# Altium integrated library 兰格封装.IntLib: 1176 symbols (part 2 of 6) (continued)
## FPC  1.0MM  14P (continued)
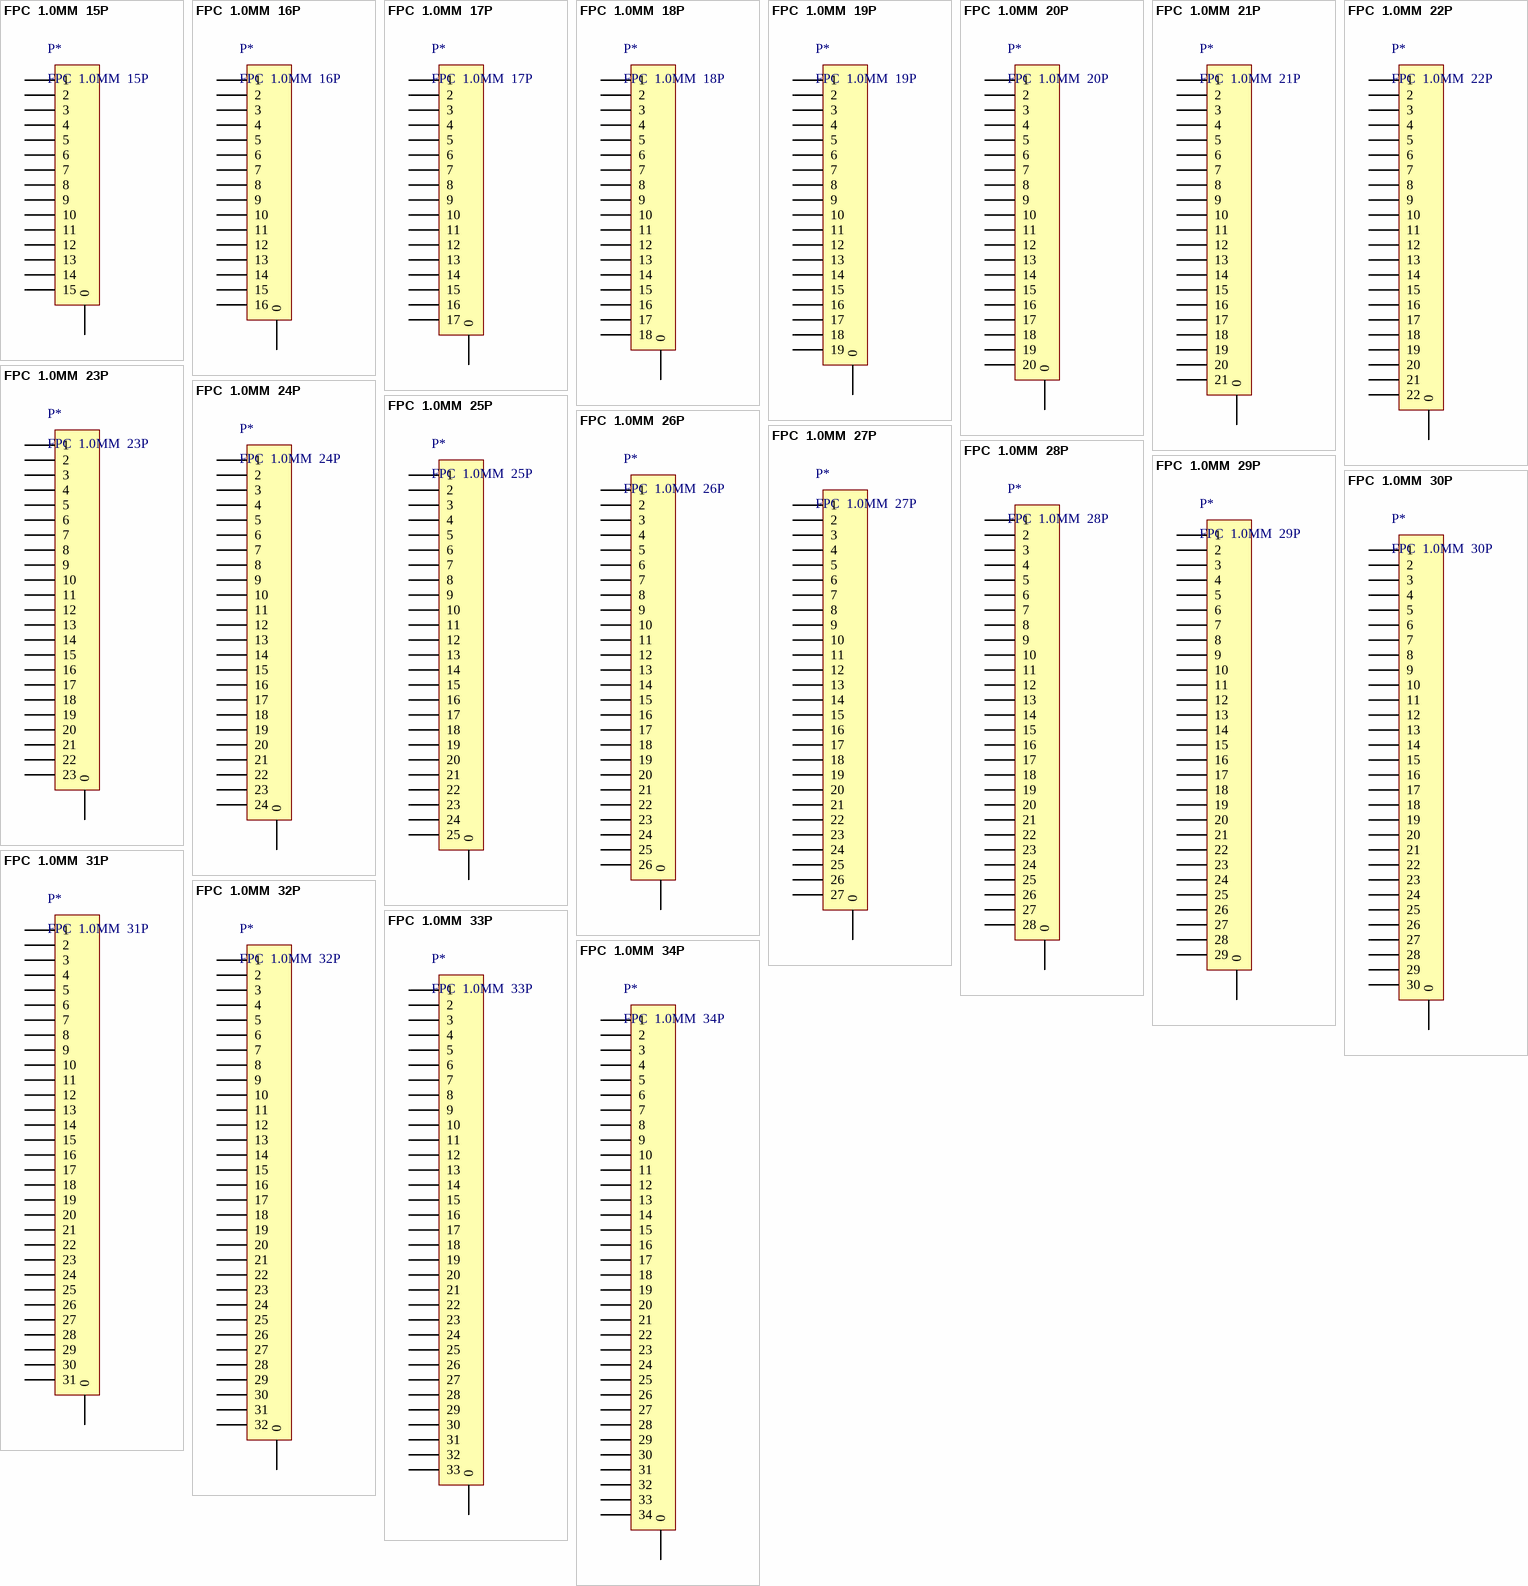
[diagram p15: symbols FPC  1.0MM  15P to FPC  1.0MM  34P]

## FPC  1.0MM  15P
designator P*
仓库名称: 五金仓; 加工方式: 贴片; 物料代码: *; 物料名称: *; 备注: *; 规格型号: *; 单位: *; 助记码: *
footprint FPC  1.0  15P (15 Pns)
pins: 0, 1, 2, 3, 4, 5, 6, 7, 8, 9, 10, 11, 12, 13, 14, 15

## FPC  1.0MM  16P
designator P*
FPC16A-1.0 200MM贴片排线 同向; 物料代码: 3.02.08.07.0001; 单位: 条; 仓库名称: 五金仓; 助记码: FPC16A-1.0TPPX TX; 加工方式: 贴片; 物料名称: FPC16A-1.0 200MM贴片排线 同向; 备注: *; 规格型号: *
footprint FPC  1.0  16P (16 Pns)
pins: 0, 1, 2, 3, 4, 5, 6, 7, 8, 9, 10, 11, 12, 13, 14, 15, 16

## FPC  1.0MM  17P
designator P*
仓库名称: 五金仓; 加工方式: 贴片; 物料代码: *; 物料名称: *; 备注: *; 规格型号: *; 单位: *; 助记码: *
footprint FPC  1.0  17P (17 Pns)
pins: 0, 1, 2, 3, 4, 5, 6, 7, 8, 9, 10, 11, 12, 13, 14, 15, 16, 17

## FPC  1.0MM  18P
designator P*
仓库名称: 五金仓; 加工方式: 贴片; 物料代码: *; 物料名称: *; 备注: *; 规格型号: *; 单位: *; 助记码: *
footprint FPC  1.0  18P (18 Pns)
pins: 0, 1, 2, 3, 4, 5, 6, 7, 8, 9, 10, 11, 12, 13, 14, 15, 16, 17, 18

## FPC  1.0MM  19P
designator P*
仓库名称: 五金仓; 加工方式: 贴片; 物料代码: *; 物料名称: *; 备注: *; 规格型号: *; 单位: *; 助记码: *
footprint FPC  1.0  19P (19 Pns)
pins: 0, 1, 2, 3, 4, 5, 6, 7, 8, 9, 10, 11, 12, 13, 14, 15, 16, 17, 18, 19

## FPC  1.0MM  20P
designator P*
仓库名称: 五金仓; 加工方式: 贴片; 物料代码: *; 物料名称: *; 备注: *; 规格型号: *; 单位: *; 助记码: *
footprint FPC  1.0  20P (20 Pns)
pins: 0, 1, 2, 3, 4, 5, 6, 7, 8, 9, 10, 11, 12, 13, 14, 15, 16, 17, 18, 19, 20

## FPC  1.0MM  21P
designator P*
仓库名称: 五金仓; 加工方式: 贴片; 物料代码: *; 物料名称: *; 备注: *; 规格型号: *; 单位: *; 助记码: *
footprint FPC  1.0  21P (21 Pns)
pins: 0, 1, 2, 3, 4, 5, 6, 7, 8, 9, 10, 11, 12, 13, 14, 15, 16, 17, 18, 19, 20, 21

## FPC  1.0MM  22P
designator P*
仓库名称: 五金仓; 加工方式: 贴片; 物料代码: *; 物料名称: *; 备注: *; 规格型号: *; 单位: *; 助记码: *
footprint FPC  1.0  22P (22 Pns)
pins: 0, 1, 2, 3, 4, 5, 6, 7, 8, 9, 10, 11, 12, 13, 14, 15, 16, 17, 18, 19, 20, 21, 22

## FPC  1.0MM  23P
designator P*
仓库名称: 五金仓; 加工方式: 贴片; 物料代码: *; 物料名称: *; 备注: *; 规格型号: *; 单位: *; 助记码: *
footprint FPC  1.0  23P (23 Pns)
pins: 0, 1, 2, 3, 4, 5, 6, 7, 8, 9, 10, 11, 12, 13, 14, 15, 16, 17, 18, 19, 20, 21, 22, 23

## FPC  1.0MM  24P
designator P*
仓库名称: 五金仓; 加工方式: 贴片; 物料代码: *; 物料名称: *; 备注: *; 规格型号: *; 单位: *; 助记码: *
footprint FPC  1.0  24P (24 Pns)
pins: 0, 1, 2, 3, 4, 5, 6, 7, 8, 9, 10, 11, 12, 13, 14, 15, 16, 17, 18, 19, 20, 21, 22, 23, 24

## FPC  1.0MM  25P
designator P*
仓库名称: 五金仓; 加工方式: 贴片; 物料代码: *; 物料名称: *; 备注: *; 规格型号: *; 单位: *; 助记码: *
footprint FPC  1.0  25P (25 Pns)
pins: 0, 1, 2, 3, 4, 5, 6, 7, 8, 9, 10, 11, 12, 13, 14, 15, 16, 17, 18, 19, 20, 21, 22, 23, 24, 25

## FPC  1.0MM  26P
designator P*
仓库名称: 五金仓; 加工方式: 贴片; 物料代码: *; 物料名称: *; 备注: *; 规格型号: *; 单位: *; 助记码: *
footprint FPC  1.0  26P (26 Pns)
pins: 0, 1, 2, 3, 4, 5, 6, 7, 8, 9, 10, 11, 12, 13, 14, 15, 16, 17, 18, 19, 20, 21, 22, 23, 24, 25, 26

## FPC  1.0MM  27P
designator P*
仓库名称: 五金仓; 加工方式: 贴片; 物料代码: *; 物料名称: *; 备注: *; 规格型号: *; 单位: *; 助记码: *
footprint FPC  1.0  27P (27 Pns)
pins: 0, 1, 2, 3, 4, 5, 6, 7, 8, 9, 10, 11, 12, 13, 14, 15, 16, 17, 18, 19, 20, 21, 22, 23, 24, 25, 26, 27

## FPC  1.0MM  28P
designator P*
仓库名称: 五金仓; 加工方式: 贴片; 物料代码: *; 物料名称: *; 备注: *; 规格型号: *; 单位: *; 助记码: *
footprint FPC  1.0  28P (28 Pns)
pins: 0, 1, 2, 3, 4, 5, 6, 7, 8, 9, 10, 11, 12, 13, 14, 15, 16, 17, 18, 19, 20, 21, 22, 23, 24, 25, 26, 27, 28

## FPC  1.0MM  29P
designator P*
仓库名称: 五金仓; 加工方式: 贴片; 物料代码: *; 物料名称: *; 备注: *; 规格型号: *; 单位: *; 助记码: *
footprint FPC  1.0  29P (29 Pns)
pins: 0, 1, 2, 3, 4, 5, 6, 7, 8, 9, 10, 11, 12, 13, 14, 15, 16, 17, 18, 19, 20, 21, 22, 23, 24, 25, 26, 27, 28, 29

## FPC  1.0MM  30P
designator P*
仓库名称: 五金仓; 加工方式: 贴片; 物料代码: *; 物料名称: *; 备注: *; 规格型号: *; 单位: *; 助记码: *
footprint FPC  1.0  30P (30 Pns)
pins: 0, 1, 2, 3, 4, 5, 6, 7, 8, 9, 10, 11, 12, 13, 14, 15, 16, 17, 18, 19, 20, 21, 22, 23, 24, 25, 26, 27, 28, 29, 30

## FPC  1.0MM  31P
designator P*
仓库名称: 五金仓; 加工方式: 贴片; 物料代码: *; 物料名称: *; 备注: *; 规格型号: *; 单位: *; 助记码: *
footprint FPC  1.0  31P (31 Pns)
pins: 0, 1, 2, 3, 4, 5, 6, 7, 8, 9, 10, 11, 12, 13, 14, 15, 16, 17, 18, 19, 20, 21, 22, 23, 24, 25, 26, 27, 28, 29, 30, 31

## FPC  1.0MM  32P
designator P*
仓库名称: 五金仓; 加工方式: 贴片; 物料代码: *; 物料名称: *; 备注: *; 规格型号: *; 单位: *; 助记码: *
footprint FPC  1.0  32P (32 Pins)
pins: 0, 1, 2, 3, 4, 5, 6, 7, 8, 9, 10, 11, 12, 13, 14, 15, 16, 17, 18, 19, 20, 21, 22, 23, 24, 25, 26, 27, 28, 29, 30, 31, 32

## FPC  1.0MM  33P
designator P*
仓库名称: 五金仓; 加工方式: 贴片; 物料代码: *; 物料名称: *; 备注: *; 规格型号: *; 单位: *; 助记码: *
footprint FPC  1.0  33P (33 Pins)
pins: 0, 1, 2, 3, 4, 5, 6, 7, 8, 9, 10, 11, 12, 13, 14, 15, 16, 17, 18, 19, 20, 21, 22, 23, 24, 25, 26, 27, 28, 29, 30, 31, 32, 33

## FPC  1.0MM  34P
designator P*
仓库名称: 五金仓; 加工方式: 贴片; 物料代码: *; 物料名称: *; 备注: *; 规格型号: *; 单位: *; 助记码: *
footprint FPC  1.0  34P (34 Pins)
pins: 0, 1, 2, 3, 4, 5, 6, 7, 8, 9, 10, 11, 12, 13, 14, 15, 16, 17, 18, 19, 20, 21, 22, 23, 24, 25, 26, 27, 28, 29, 30, 31, 32, 33, 34

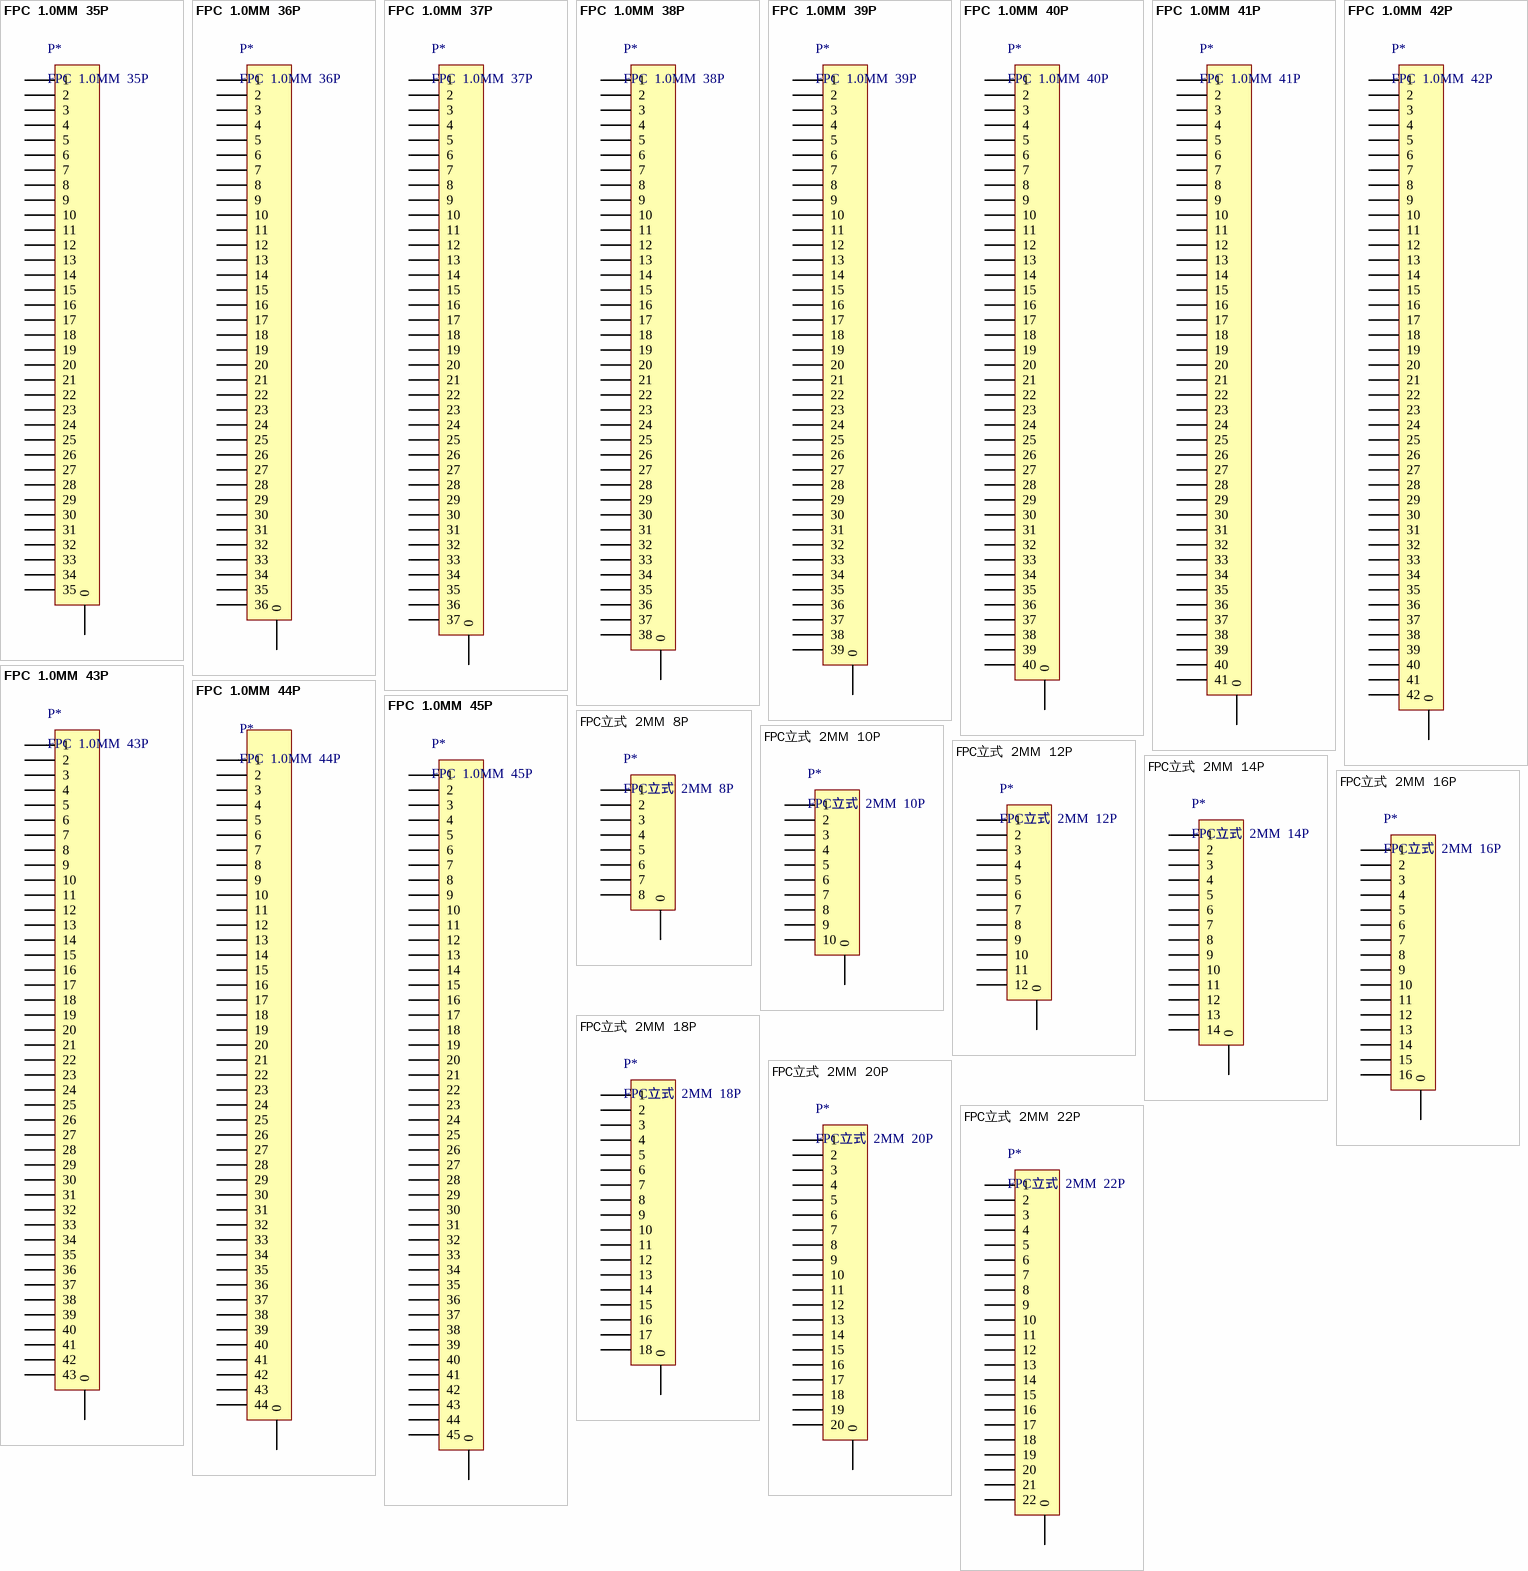
[diagram p16: symbols FPC  1.0MM  35P to FPC立式  2MM  22P]

## FPC  1.0MM  35P
designator P*
仓库名称: 五金仓; 加工方式: 贴片; 物料代码: *; 物料名称: *; 备注: *; 规格型号: *; 单位: *; 助记码: *
footprint FPC  1.0  35P (35 Pins)
pins: 0, 1, 2, 3, 4, 5, 6, 7, 8, 9, 10, 11, 12, 13, 14, 15, 16, 17, 18, 19, 20, 21, 22, 23, 24, 25, 26, 27, 28, 29, 30, 31, 32, 33, 34, 35

## FPC  1.0MM  36P
designator P*
仓库名称: 五金仓; 加工方式: 贴片; 物料代码: *; 物料名称: *; 备注: *; 规格型号: *; 单位: *; 助记码: *
footprint FPC  1.0  36P (36 Pins)
pins: 0, 1, 2, 3, 4, 5, 6, 7, 8, 9, 10, 11, 12, 13, 14, 15, 16, 17, 18, 19, 20, 21, 22, 23, 24, 25, 26, 27, 28, 29, 30, 31, 32, 33, 34, 35, 36

## FPC  1.0MM  37P
designator P*
仓库名称: 五金仓; 加工方式: 贴片; 物料代码: *; 物料名称: *; 备注: *; 规格型号: *; 单位: *; 助记码: *
footprint FPC  1.0  37P (37 Pins)
pins: 0, 1, 2, 3, 4, 5, 6, 7, 8, 9, 10, 11, 12, 13, 14, 15, 16, 17, 18, 19, 20, 21, 22, 23, 24, 25, 26, 27, 28, 29, 30, 31, 32, 33, 34, 35, 36, 37

## FPC  1.0MM  38P
designator P*
仓库名称: 五金仓; 加工方式: 贴片; 物料代码: *; 物料名称: *; 备注: *; 规格型号: *; 单位: *; 助记码: *
footprint FPC  1.0  38P (41 Pins)
pins: 0, 1, 2, 3, 4, 5, 6, 7, 8, 9, 10, 11, 12, 13, 14, 15, 16, 17, 18, 19, 20, 21, 22, 23, 24, 25, 26, 27, 28, 29, 30, 31, 32, 33, 34, 35, 36, 37, 38

## FPC  1.0MM  39P
designator P*
仓库名称: 五金仓; 加工方式: 贴片; 物料代码: *; 物料名称: *; 备注: *; 规格型号: *; 单位: *; 助记码: *
footprint FPC  1.0  39P (39 Pins)
pins: 0, 1, 2, 3, 4, 5, 6, 7, 8, 9, 10, 11, 12, 13, 14, 15, 16, 17, 18, 19, 20, 21, 22, 23, 24, 25, 26, 27, 28, 29, 30, 31, 32, 33, 34, 35, 36, 37, 38, 39

## FPC  1.0MM  40P
designator P*
仓库名称: 五金仓; 加工方式: 贴片; 物料代码: *; 物料名称: *; 备注: *; 规格型号: *; 单位: *; 助记码: *
footprint FPC  1.0  40P (40 Pins)
pins: 0, 1, 2, 3, 4, 5, 6, 7, 8, 9, 10, 11, 12, 13, 14, 15, 16, 17, 18, 19, 20, 21, 22, 23, 24, 25, 26, 27, 28, 29, 30, 31, 32, 33, 34, 35, 36, 37, 38, 39, 40

## FPC  1.0MM  41P
designator P*
仓库名称: 五金仓; 加工方式: 贴片; 物料代码: *; 物料名称: *; 备注: *; 规格型号: *; 单位: *; 助记码: *
footprint FPC  1.0  41P (41 Pins)
pins: 0, 1, 2, 3, 4, 5, 6, 7, 8, 9, 10, 11, 12, 13, 14, 15, 16, 17, 18, 19, 20, 21, 22, 23, 24, 25, 26, 27, 28, 29, 30, 31, 32, 33, 34, 35, 36, 37, 38, 39, 40, 41

## FPC  1.0MM  42P
designator P*
仓库名称: 五金仓; 加工方式: 贴片; 物料代码: *; 物料名称: *; 备注: *; 规格型号: *; 单位: *; 助记码: *
footprint FPC  1.0  42P (42 Pins)
pins: 0, 1, 2, 3, 4, 5, 6, 7, 8, 9, 10, 11, 12, 13, 14, 15, 16, 17, 18, 19, 20, 21, 22, 23, 24, 25, 26, 27, 28, 29, 30, 31, 32, 33, 34, 35, 36, 37, 38, 39, 40, 41, 42

## FPC  1.0MM  43P
designator P*
仓库名称: 五金仓; 加工方式: 贴片; 物料代码: *; 物料名称: *; 备注: *; 规格型号: *; 单位: *; 助记码: *
footprint FPC  1.0  43P (43 Pins)
pins: 0, 1, 2, 3, 4, 5, 6, 7, 8, 9, 10, 11, 12, 13, 14, 15, 16, 17, 18, 19, 20, 21, 22, 23, 24, 25, 26, 27, 28, 29, 30, 31, 32, 33, 34, 35, 36, 37, 38, 39, 40, 41, 42, 43

## FPC  1.0MM  44P
designator P*
仓库名称: 五金仓; 加工方式: 贴片; 物料代码: *; 物料名称: *; 备注: *; 规格型号: *; 单位: *; 助记码: *
footprint FPC  1.0  44P (44 Pins)
pins: 0, 1, 2, 3, 4, 5, 6, 7, 8, 9, 10, 11, 12, 13, 14, 15, 16, 17, 18, 19, 20, 21, 22, 23, 24, 25, 26, 27, 28, 29, 30, 31, 32, 33, 34, 35, 36, 37, 38, 39, 40, 41, 42, 43, 44

## FPC  1.0MM  45P
designator P*
仓库名称: 五金仓; 加工方式: 贴片; 物料代码: *; 物料名称: *; 备注: *; 规格型号: *; 单位: *; 助记码: *
footprint FPC  1.0  45P (45 Pins)
pins: 0, 1, 2, 3, 4, 5, 6, 7, 8, 9, 10, 11, 12, 13, 14, 15, 16, 17, 18, 19, 20, 21, 22, 23, 24, 25, 26, 27, 28, 29, 30, 31, 32, 33, 34, 35, 36, 37, 38, 39, 40, 41, 42, 43, 44, 45

## FPC立式  2MM  8P
designator P*
单位: ֻ; 仓库名称: 五金仓; 加工方式: 贴片; 物料代码: *; 物料名称: *; 备注: *; 规格型号: *; 助记码: *
footprint FPC立式  2MM  8P (连接DSP)
pins: 0, 1, 2, 3, 4, 5, 6, 7, 8

## FPC立式  2MM  10P
designator P*
单位: ֻ; 仓库名称: 五金仓; 加工方式: 贴片; 物料代码: *; 物料名称: *; 备注: *; 规格型号: *; 助记码: *
footprint FPC立式  2MM  10P (连DSP)
pins: 0, 1, 2, 3, 4, 5, 6, 7, 8, 9, 10

## FPC立式  2MM  12P
designator P*
单位: ֻ; 仓库名称: 五金仓; 加工方式: 贴片; 物料代码: *; 物料名称: *; 备注: *; 规格型号: *; 助记码: *
footprint FPC立式  2MM  12P (连DSP)
pins: 0, 1, 2, 3, 4, 5, 6, 7, 8, 9, 10, 11, 12

## FPC立式  2MM  14P
designator P*
单位: ֻ; 仓库名称: 五金仓; 加工方式: 贴片; 物料代码: *; 物料名称: *; 备注: *; 规格型号: *; 助记码: *
footprint FPC立式  2MM  14P (连DSP)
pins: 0, 1, 2, 3, 4, 5, 6, 7, 8, 9, 10, 11, 12, 13, 14

## FPC立式  2MM  16P
designator P*
FPC16A-1.0立式贴片排线座; 物料代码: 3.02.08.07.0002; 单位: ֻ; 仓库名称: 五金仓; 助记码: FPC16A-1.0LSTPPXZ; 加工方式: 贴片; 物料名称: FPC16A-1.0立式贴片排线座; 备注: *; 规格型号: *
footprint FPC立式  2MM  16P (连DSP)
pins: 0, 1, 2, 3, 4, 5, 6, 7, 8, 9, 10, 11, 12, 13, 14, 15, 16

## FPC立式  2MM  18P
designator P*
单位: ֻ; 仓库名称: 五金仓; 加工方式: 贴片; 物料代码: *; 物料名称: *; 备注: *; 规格型号: *; 助记码: *
footprint FPC立式  2MM  18P (连DSP)
pins: 0, 1, 2, 3, 4, 5, 6, 7, 8, 9, 10, 11, 12, 13, 14, 15, 16, 17, 18

## FPC立式  2MM  20P
designator P*
单位: ֻ; 仓库名称: 五金仓; 加工方式: 贴片; 物料代码: *; 物料名称: *; 备注: *; 规格型号: *; 助记码: *
footprint FPC立式  2MM  20P (连DSP)
pins: 0, 1, 2, 3, 4, 5, 6, 7, 8, 9, 10, 11, 12, 13, 14, 15, 16, 17, 18, 19, 20

## FPC立式  2MM  22P
designator P*
单位: ֻ; 仓库名称: 五金仓; 加工方式: 贴片; 物料代码: *; 物料名称: *; 备注: *; 规格型号: *; 助记码: *
footprint FPC立式  2MM  22P (连DSP)
pins: 0, 1, 2, 3, 4, 5, 6, 7, 8, 9, 10, 11, 12, 13, 14, 15, 16, 17, 18, 19, 20, 21, 22

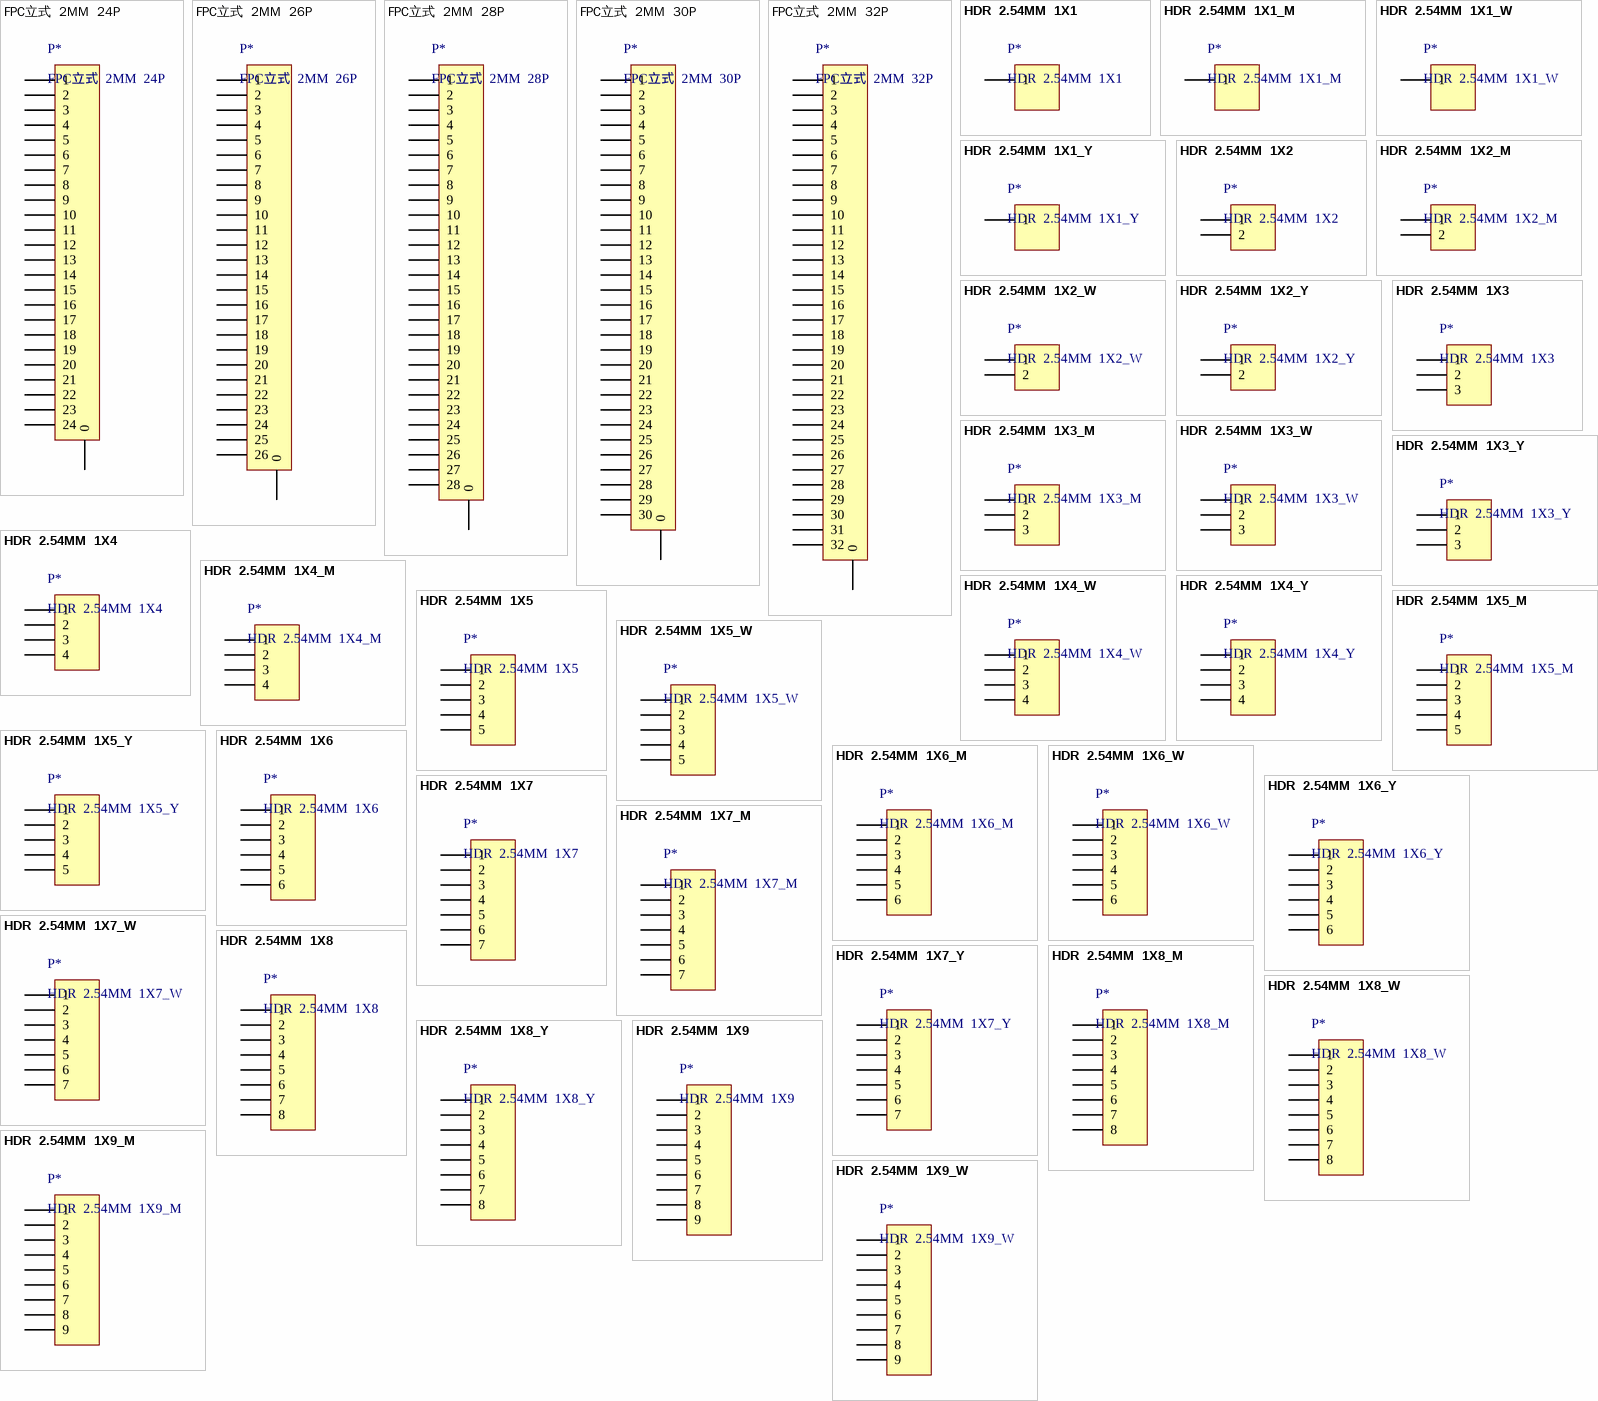
[diagram p17: symbols FPC立式  2MM  24P to HDR  2.54MM  1X9_W]

## FPC立式  2MM  24P
designator P*
单位: ֻ; 仓库名称: 五金仓; 加工方式: 贴片; 物料代码: *; 物料名称: *; 备注: *; 规格型号: *; 助记码: *
footprint FPC立式  2MM  24P (连DSP)
pins: 0, 1, 2, 3, 4, 5, 6, 7, 8, 9, 10, 11, 12, 13, 14, 15, 16, 17, 18, 19, 20, 21, 22, 23, 24

## FPC立式  2MM  26P
designator P*
单位: ֻ; 仓库名称: 五金仓; 加工方式: 贴片; 物料代码: *; 物料名称: *; 备注: *; 规格型号: *; 助记码: *
footprint FPC立式  2MM  26P (连DSP)
pins: 0, 1, 2, 3, 4, 5, 6, 7, 8, 9, 10, 11, 12, 13, 14, 15, 16, 17, 18, 19, 20, 21, 22, 23, 24, 25, 26

## FPC立式  2MM  28P
designator P*
单位: ֻ; 仓库名称: 五金仓; 加工方式: 贴片; 物料代码: *; 物料名称: *; 备注: *; 规格型号: *; 助记码: *
footprint FPC立式  2MM  28P (连DSP)
pins: 0, 1, 2, 3, 4, 5, 6, 7, 8, 9, 10, 11, 12, 13, 14, 15, 16, 17, 18, 19, 20, 21, 22, 23, 24, 25, 26, 27, 28

## FPC立式  2MM  30P
designator P*
单位: ֻ; 仓库名称: 五金仓; 加工方式: 贴片; 物料代码: *; 物料名称: *; 备注: *; 规格型号: *; 助记码: *
footprint FPC立式  2MM  30P (连DSP)
pins: 0, 1, 2, 3, 4, 5, 6, 7, 8, 9, 10, 11, 12, 13, 14, 15, 16, 17, 18, 19, 20, 21, 22, 23, 24, 25, 26, 27, 28, 29, 30

## FPC立式  2MM  32P
designator P*
单位: ֻ; 仓库名称: 五金仓; 加工方式: 贴片; 物料代码: *; 物料名称: *; 备注: *; 规格型号: *; 助记码: *
footprint FPC立式  2MM  32P (连DSP)
pins: 0, 1, 2, 3, 4, 5, 6, 7, 8, 9, 10, 11, 12, 13, 14, 15, 16, 17, 18, 19, 20, 21, 22, 23, 24, 25, 26, 27, 28, 29, 30, 31, 32

## HDR  2.54MM  1X1
designator P*
仓库名称: 五金仓; 加工方式: 插件; 规格型号: *; 物料代码: *; 物料名称: *; 备注: *; 单位: *; 助记码: *
footprint HDR-1X1 (排针，1脚)
pins: 1

## HDR  2.54MM  1X1_M
designator P*
仓库名称: 五金仓; 加工方式: 插件; 规格型号: *; 物料名称: *; 备注: *; 物料代码: *; 单位: *; 助记码: *
footprint HDR-1X1_M (排母，1脚)
pins: 1

## HDR  2.54MM  1X1_W
designator P*
仓库名称: 五金仓; 加工方式: 插件; 物料名称: *; 规格型号: *; 助记码: *; 单位: *; 备注: *; 物料代码: *
footprint HDR-1X1_W (弯脚排针，1脚)
pins: 1

## HDR  2.54MM  1X1_Y
designator P*
仓库名称: 五金仓; 加工方式: 插件; 规格型号: *; 物料代码: *; 物料名称: *; 助记码: *; 单位: *; 备注: *
footprint HDR-1X1_Y (圆孔排母，1脚)
pins: 1

## HDR  2.54MM  1X2
designator P*
仓库名称: 五金仓; 加工方式: 插件; 规格型号: *; 物料名称: *; 助记码: *; 单位: *; 备注: *; 物料代码: *
footprint HDR-1x2 (排针，2脚)
pins: 1, 2

## HDR  2.54MM  1X2_M
designator P*
仓库名称: 五金仓; 加工方式: 插件; 规格型号: *; 备注: *; 物料代码: *; 助记码: *; 物料名称: *; 单位: *
footprint HDR-1X2_M (排母，2脚)
pins: 1, 2

## HDR  2.54MM  1X2_W
designator P*
仓库名称: 五金仓; 加工方式: 插件; 规格型号: *; 助记码: *; 单位: *; 备注: *; 物料代码: *; 物料名称: *
footprint HDR-1X2_W (弯脚排针，2脚)
pins: 1, 2

## HDR  2.54MM  1X2_Y
designator P*
仓库名称: 五金仓; 加工方式: 插件; 规格型号: *; 单位: *; 助记码: *; 备注: *; 物料代码: *; 物料名称: *
footprint HDR-1X2_Y (圆孔排母，2脚)
pins: 1, 2

## HDR  2.54MM  1X3
designator P*
仓库名称: 五金仓; 加工方式: 插件; 助记码: *; 单位: *; 备注: *; 物料代码: *; 物料名称: *; 规格型号: *
footprint HDR-1X3 (排针，3脚)
pins: 1, 2, 3

## HDR  2.54MM  1X3_M
designator P*
仓库名称: 五金仓; 加工方式: 插件; 规格型号: *; 备注: *; 单位: *; 物料代码: *; 助记码: *
footprint HDR-1X3_M (排母，3脚)
pins: 1, 2, 3

## HDR  2.54MM  1X3_W
designator P*
仓库名称: 五金仓; 加工方式: 插件; 助记码: *; 规格型号: *; 物料代码: *; 物料名称: *; 单位: *; 备注: *
footprint HDR-1X3_W (弯脚排针，3脚)
pins: 1, 2, 3

## HDR  2.54MM  1X3_Y
designator P*
仓库名称: 五金仓; 加工方式: 插件; 物料名称: *; 规格型号: *; 助记码: *; 单位: *; 备注: *; 物料代码: *
footprint HDR-1X3_Y (圆孔排母，3脚)
pins: 1, 2, 3

## HDR  2.54MM  1X4
designator P*
仓库名称: 五金仓; 加工方式: 插件; 规格型号: *; 助记码: *; 单位: *; 备注: *; 物料代码: *; 物料名称: *
footprint HDR-1X4 (排针，4脚)
pins: 1, 2, 3, 4

## HDR  2.54MM  1X4_M
designator P*
仓库名称: 五金仓; 加工方式: 插件; 规格型号: *; 助记码: *; 单位: *; 备注: *; 物料代码: *; 物料名称: *
footprint HDR-1X4_M (排母，4脚)
pins: 1, 2, 3, 4

## HDR  2.54MM  1X4_W
designator P*
仓库名称: 五金仓; 加工方式: 插件; 规格型号: *; 助记码: *; 单位: *; 备注: *; 物料代码: *; 物料名称: *
footprint HDR-1X4_W (弯脚排针，4脚)
pins: 1, 2, 3, 4

## HDR  2.54MM  1X4_Y
designator P*
仓库名称: 五金仓; 加工方式: 插件; 规格型号: *; 物料名称: *; 助记码: *; 备注: *; 物料代码: *; 单位: *
footprint HDR-1X4_Y (圆孔排母，4脚)
pins: 1, 2, 3, 4

## HDR  2.54MM  1X5
designator P*
仓库名称: 五金仓; 加工方式: 插件; 单位: *; 助记码: *; 备注: *; 物料代码: *; 物料名称: *; 规格型号: *
footprint HDR-1X5 (排针，5脚)
pins: 1, 2, 3, 4, 5

## HDR  2.54MM  1X5_M
designator P*
仓库名称: 五金仓; 加工方式: 插件; 物料代码: *; 备注: *; 规格型号: *; 物料名称: *; 单位: *; 助记码: *
footprint HDR-1X5_M (排母，5脚)
pins: 1, 2, 3, 4, 5

## HDR  2.54MM  1X5_W
designator P*
仓库名称: 五金仓; 加工方式: 插件; 助记码: *; 备注: *; 物料代码: *; 物料名称: *; 规格型号: *; 单位: *
footprint HDR-1X5_W (弯脚排针，5脚)
pins: 1, 2, 3, 4, 5

## HDR  2.54MM  1X5_Y
designator P*
仓库名称: 五金仓; 加工方式: 插件; 助记码: *; 物料名称: *; 规格型号: *; 单位: *; 备注: *; 物料代码: *
footprint HDR-1X5_Y (圆孔排母，5脚)
pins: 1, 2, 3, 4, 5

## HDR  2.54MM  1X6
designator P*
仓库名称: 五金仓; 加工方式: 插件; 助记码: *; 物料代码: *; 单位: *; 备注: *; 物料名称: *; 规格型号: *
footprint HDR-1X6 (排针，6脚)
pins: 1, 2, 3, 4, 5, 6

## HDR  2.54MM  1X6_M
designator P*
仓库名称: 五金仓; 加工方式: 插件; 物料名称: *; 规格型号: *; 助记码: *; 单位: *; 备注: *; 物料代码: *
footprint HDR-1X6_M (排母，6脚)
pins: 1, 2, 3, 4, 5, 6

## HDR  2.54MM  1X6_W
designator P*
仓库名称: 五金仓; 加工方式: 插件; 助记码: *; 单位: *; 备注: *; 物料代码: *; 物料名称: *; 规格型号: *
footprint HDR-1X6_W (弯脚排针，6脚)
pins: 1, 2, 3, 4, 5, 6

## HDR  2.54MM  1X6_Y
designator P*
仓库名称: 五金仓; 加工方式: 插件; 助记码: *; 单位: *; 备注: *; 物料代码: *; 物料名称: *; 规格型号: *
footprint HDR-1X6_Y (圆孔排母，6脚)
pins: 1, 2, 3, 4, 5, 6

## HDR  2.54MM  1X7
designator P*
仓库名称: 五金仓; 加工方式: 插件; 规格型号: *; 助记码: *; 单位: *; 备注: *; 物料代码: *; 物料名称: *
footprint HDR-1X7 (排针，8脚)
pins: 1, 2, 3, 4, 5, 6, 7

## HDR  2.54MM  1X7_M
designator P*
仓库名称: 五金仓; 加工方式: 插件; 助记码: *; 单位: *; 备注: *; 物料代码: *; 物料名称: *; 饿了的吗: *
footprint HDR-1X7_M (排母，7脚)
pins: 1, 2, 3, 4, 5, 6, 7

## HDR  2.54MM  1X7_W
designator P*
仓库名称: 五金仓; 加工方式: 插件; 单位: *; 助记码: *; 物料名称: *; 规格型号: *; 备注: *; 物料代码: *
footprint HDR-1X7_W (弯脚排针，7脚)
pins: 1, 2, 3, 4, 5, 6, 7

## HDR  2.54MM  1X7_Y
designator P*
仓库名称: 五金仓; 加工方式: 插件; 助记码: *; 单位: *; 备注: *; 物料代码: *; 物料名称: *; 规格型号: *
footprint HDR-1X7_Y (圆孔排母，7脚)
pins: 1, 2, 3, 4, 5, 6, 7

## HDR  2.54MM  1X8
designator P*
仓库名称: 五金仓; 加工方式: 插件; 助记码: *; 单位: *; 备注: *; 物料代码: *; 物料名称: *; 规格型号: *
footprint HDR-1X8 (排针，8脚)
pins: 1, 2, 3, 4, 5, 6, 7, 8

## HDR  2.54MM  1X8_M
designator P*
仓库名称: 五金仓; 加工方式: 插件; 助记码: *; 单位: *; 备注: *; 物料名称: *; 物料代码: *; 规格型号: *
footprint HDR-1X8_M (排母，8脚)
pins: 1, 2, 3, 4, 5, 6, 7, 8

## HDR  2.54MM  1X8_W
designator P*
仓库名称: 五金仓; 加工方式: 插件; 助记码: *; 单位: *; 物料代码: *; 备注: *; 规格型号: *; 物料名称: *
footprint HDR-1X8_W (弯脚排针，8脚)
pins: 1, 2, 3, 4, 5, 6, 7, 8

## HDR  2.54MM  1X8_Y
designator P*
仓库名称: 五金仓; 加工方式: 插件; 物料名称: *; 单位: *; 助记码: *; 规格型号: *; 物料代码: *; 备注: *
footprint HDR-1X8_Y (圆孔排母，8脚)
pins: 1, 2, 3, 4, 5, 6, 7, 8

## HDR  2.54MM  1X9
designator P*
仓库名称: 五金仓; 加工方式: 插件; 助记码: *; 单位: *; 备注: *; 物料代码: *; 物料名称: *; 规格型号: *
footprint HDR-1X9 (排针，9脚)
pins: 1, 2, 3, 4, 5, 6, 7, 8, 9

## HDR  2.54MM  1X9_M
designator P*
仓库名称: 五金仓; 加工方式: 插件; 物料名称: *; 规格型号: *; 助记码: *; 单位: *; 备注: *; 物料代码: *
footprint HDR-1X9_M (排母，9脚)
pins: 1, 2, 3, 4, 5, 6, 7, 8, 9

## HDR  2.54MM  1X9_W
designator P*
仓库名称: 五金仓; 加工方式: 插件; 助记码: *; 物料名称: *; 备注: *; 规格型号: *; 物料代码: *; 单位: *
footprint HDR-1X9_W (弯脚排针，9脚)
pins: 1, 2, 3, 4, 5, 6, 7, 8, 9

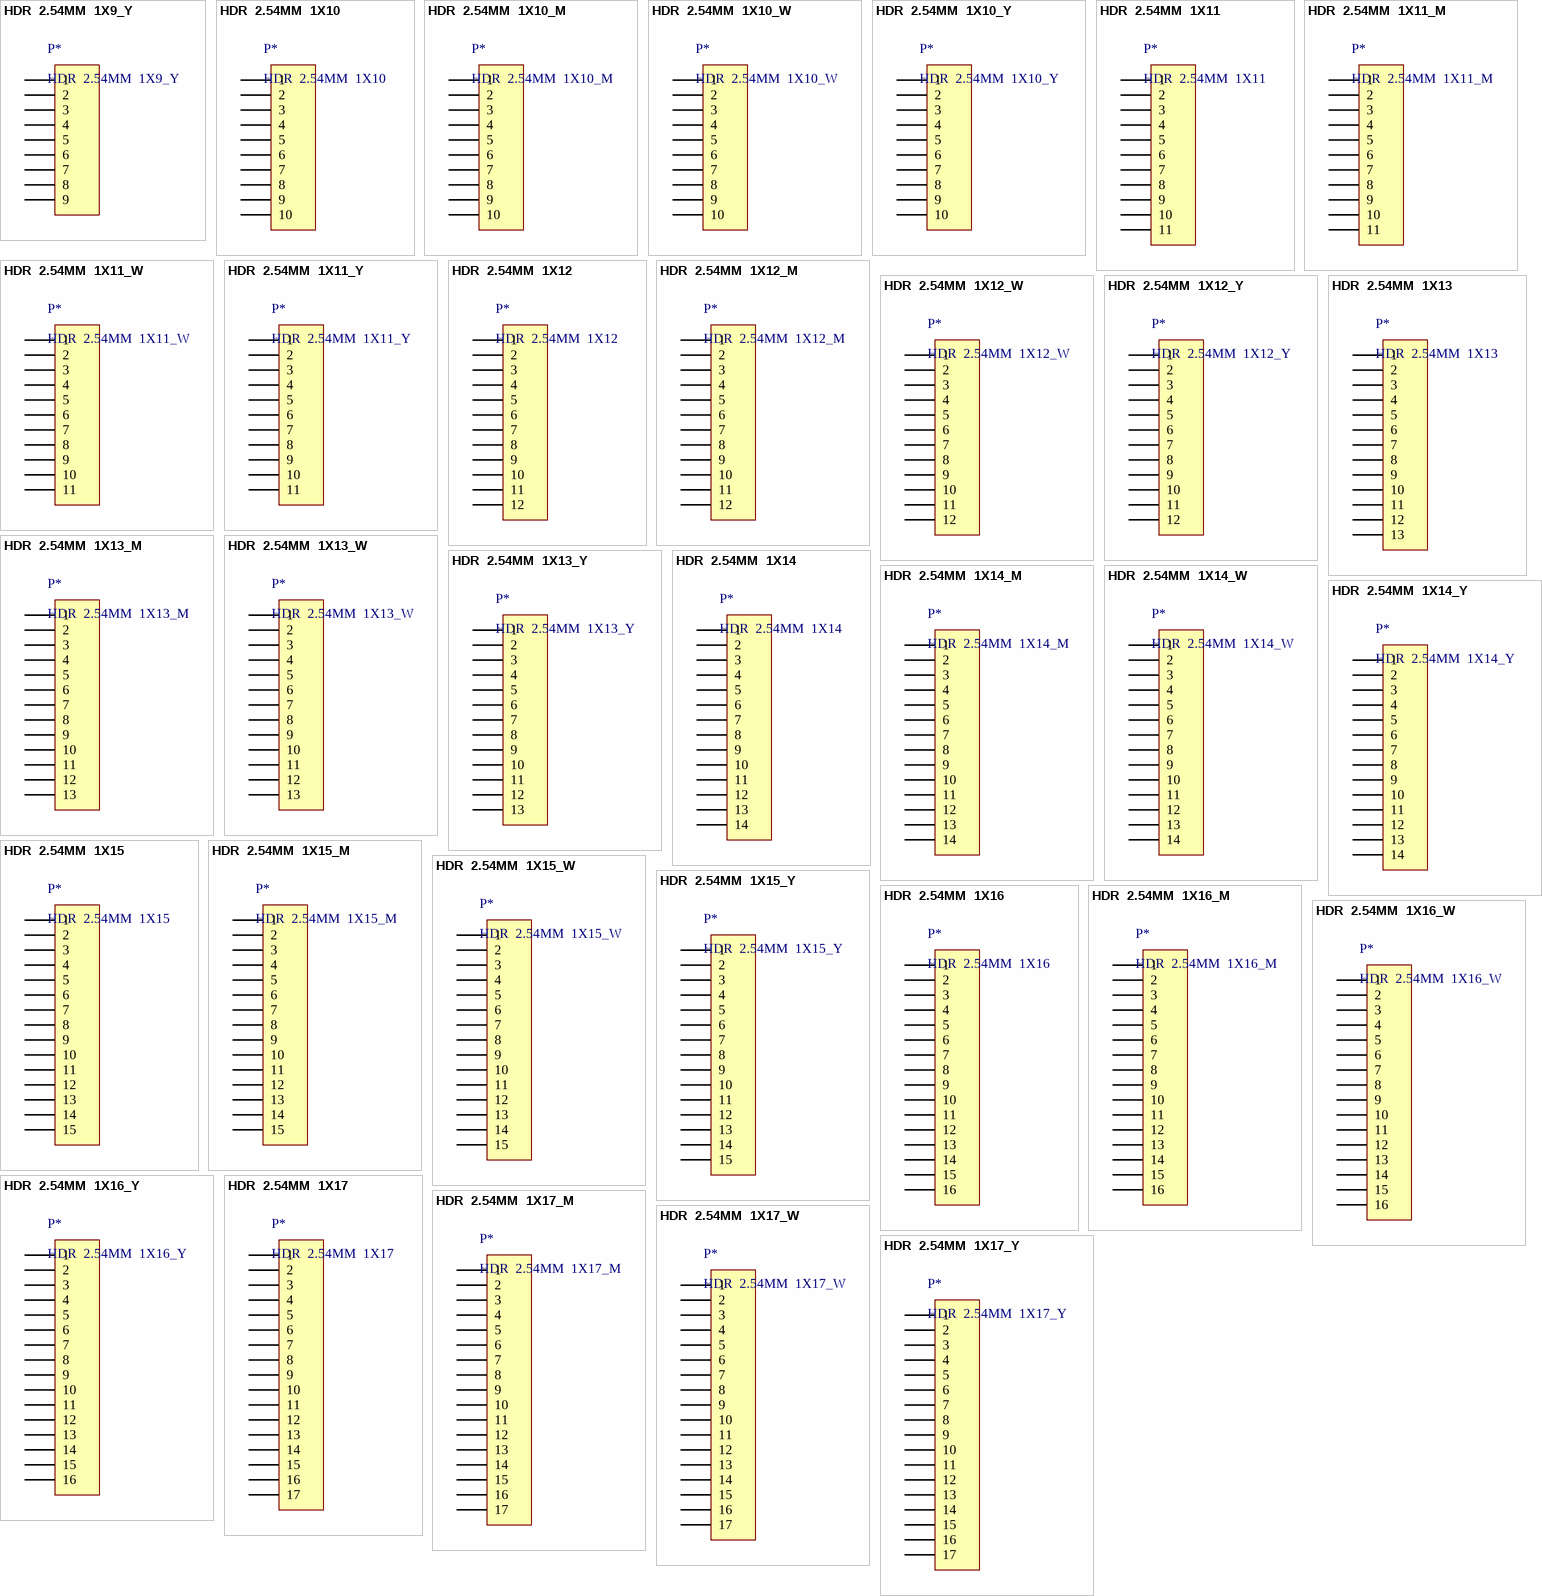
[diagram p18: symbols HDR  2.54MM  1X9_Y to HDR  2.54MM  1X17_Y]

## HDR  2.54MM  1X9_Y
designator P*
仓库名称: 五金仓; 加工方式: 插件; 助记码: *; 单位: *; 备注: *; 我李代沫: *; 物料名称: *; 规格型号: *
footprint HDR-1X9_Y (圆孔排母，9脚)
pins: 1, 2, 3, 4, 5, 6, 7, 8, 9

## HDR  2.54MM  1X10
designator P*
仓库名称: 五金仓; 加工方式: 插件; 助记码: *; 单位: *; 备注: *; 物料代码: *; 物料名称: *; 规格型号: *
footprint HDR-1X10 (排针，10脚)
pins: 1, 2, 3, 4, 5, 6, 7, 8, 9, 10

## HDR  2.54MM  1X10_M
designator P*
仓库名称: 五金仓; 加工方式: 插件; 物料名称: *; 规格型号: *; 助记码: *; 单位: *; 备注: *; 物料代码: *
footprint HDR-1X10_M (排母，10脚)
pins: 1, 2, 3, 4, 5, 6, 7, 8, 9, 10

## HDR  2.54MM  1X10_W
designator P*
仓库名称: 五金仓; 加工方式: 插件; 规格型号: *; 备注: *; 助记码: *; 单位: *; 物料代码: *
footprint HDR-1X10_W (弯脚排针，10脚)
pins: 1, 2, 3, 4, 5, 6, 7, 8, 9, 10

## HDR  2.54MM  1X10_Y
designator P*
仓库名称: 五金仓; 加工方式: 插件; 规格型号: *; 物料名称: *; 助记码: *; 单位: *; 物料代码: *; 备注: *
footprint HDR-1X10_Y (圆孔排母，10脚)
pins: 1, 2, 3, 4, 5, 6, 7, 8, 9, 10

## HDR  2.54MM  1X11
designator P*
仓库名称: 五金仓; 加工方式: 插件; 物料名称: *; 规格型号: *; 备注: *; 物料代码: *; 单位: *; 助记码: *
footprint HDR-1X11 (排针)
pins: 1, 2, 3, 4, 5, 6, 7, 8, 9, 10, 11

## HDR  2.54MM  1X11_M
designator P*
仓库名称: 五金仓; 加工方式: 插件; 物料代码: *; 助记码: *; 备注: *; 单位: *; 物料名称: *; 规格型号: *
footprint HDR-1X11_M (排母，11脚)
pins: 1, 2, 3, 4, 5, 6, 7, 8, 9, 10, 11

## HDR  2.54MM  1X11_W
designator P*
仓库名称: 五金仓; 加工方式: 插件; 规格型号: *; 物料名称: *; 助记码: *; 单位: *; 备注: *; 物料代码: *
footprint HDR-1X11_W (弯脚排针，11脚)
pins: 1, 2, 3, 4, 5, 6, 7, 8, 9, 10, 11

## HDR  2.54MM  1X11_Y
designator P*
仓库名称: 五金仓; 加工方式: 插件; 单位: *; 助记码: *; 备注: *; 物料代码: *; 物料名称: *; 规格型号: *
footprint HDR-1X11_Y (圆孔排母，11脚)
pins: 1, 2, 3, 4, 5, 6, 7, 8, 9, 10, 11

## HDR  2.54MM  1X12
designator P*
仓库名称: 五金仓; 加工方式: 插件; 助记码: *; 备注: *; 物料代码: *; 规格型号: *; 单位: *; 物料名称: *
footprint HDR-1X12 (排针，13脚)
pins: 1, 2, 3, 4, 5, 6, 7, 8, 9, 10, 11, 12

## HDR  2.54MM  1X12_M
designator P*
仓库名称: 五金仓; 加工方式: 插件; 规格型号: *; 物料名称: *; 助记码: *; 单位: *; 备注: *; 物料代码: *
footprint HDR-1X12_M (排母，12脚)
pins: 1, 2, 3, 4, 5, 6, 7, 8, 9, 10, 11, 12

## HDR  2.54MM  1X12_W
designator P*
仓库名称: 五金仓; 加工方式: 插件; 规格型号: *; 助记码: *; 单位: *; 备注: *; 物料代码: *; 物料名称: *
footprint HDR-1X12_W (弯脚排针，12脚)
pins: 1, 2, 3, 4, 5, 6, 7, 8, 9, 10, 11, 12

## HDR  2.54MM  1X12_Y
designator P*
仓库名称: 五金仓; 加工方式: 插件; 物料名称: *; 规格型号: *; 单位: *; 助记码: *; 物料代码: *; 备注: *
footprint HDR-1X12_Y (圆孔排母，12脚)
pins: 1, 2, 3, 4, 5, 6, 7, 8, 9, 10, 11, 12

## HDR  2.54MM  1X13
designator P*
仓库名称: 五金仓; 加工方式: 插件; 单位: *; 助记码: *; 备注: *; 物料代码: *; 物料名称: *; 规格型号: *
footprint HDR-1X13 (排针，13脚)
pins: 1, 2, 3, 4, 5, 6, 7, 8, 9, 10, 11, 12, 13

## HDR  2.54MM  1X13_M
designator P*
加工方式: 插件; 规格型号: *; 物料代码: *; 助记码: *; 单位: *; 仓库名称: *; 物料名称: *; 备注: *
footprint HDR-1X13_M (排母，13脚)
pins: 1, 2, 3, 4, 5, 6, 7, 8, 9, 10, 11, 12, 13

## HDR  2.54MM  1X13_W
designator P*
仓库名称: 五金仓; 加工方式: 插件; 助记码: *; 物料名称: *; 单位: *; 备注: *; 物料代码: *; 规格型号: *
footprint HDR-1X13_W (弯脚排针，13脚)
pins: 1, 2, 3, 4, 5, 6, 7, 8, 9, 10, 11, 12, 13

## HDR  2.54MM  1X13_Y
designator P*
仓库名称: 五金仓; 加工方式: 插件; 单位: *; 助记码: *; 备注: *; 物料代码: *; 物料名称: *; 规格型号: *
footprint HDR-1X13_Y (圆孔排母，13脚)
pins: 1, 2, 3, 4, 5, 6, 7, 8, 9, 10, 11, 12, 13

## HDR  2.54MM  1X14
designator P*
仓库名称: 五金仓; 加工方式: 插件; 规格型号: *; 物料名称: *; 备注: *; 助记码: *; 单位: *; 物料代码: *
footprint HDR-1X14 (排针，14脚)
pins: 1, 2, 3, 4, 5, 6, 7, 8, 9, 10, 11, 12, 13, 14

## HDR  2.54MM  1X14_M
designator P*
仓库名称: 五金仓; 加工方式: 插件; 物料代码: *; 规格型号: *; 单位: *; 物料名称: *; 备注: *; 助记码: *
footprint HDR-1X14_M (排母，14脚)
pins: 1, 2, 3, 4, 5, 6, 7, 8, 9, 10, 11, 12, 13, 14

## HDR  2.54MM  1X14_W
designator P*
仓库名称: 五金仓; 加工方式: 插件; 物料名称: *; 规格型号: *; 单位: *; 备注: *; 物料代码: *
footprint HDR-1X14_W (弯脚排针，14脚)
pins: 1, 2, 3, 4, 5, 6, 7, 8, 9, 10, 11, 12, 13, 14

## HDR  2.54MM  1X14_Y
designator P*
仓库名称: 五金仓; 加工方式: 插件; 助记码: *; 单位: *; 备注: *; 物料代码: *; 物料名称: *; 规格型号: *
footprint HDR-1X14_Y (圆孔排母，14脚)
pins: 1, 2, 3, 4, 5, 6, 7, 8, 9, 10, 11, 12, 13, 14

## HDR  2.54MM  1X15
designator P*
仓库名称: 五金仓; 加工方式: 插件; 物料名称: *; 规格型号: *; 助记码: *; 单位: *; 备注: *; 物料代码: *
footprint HDR-1X15 (排针，15脚)
pins: 1, 2, 3, 4, 5, 6, 7, 8, 9, 10, 11, 12, 13, 14, 15

## HDR  2.54MM  1X15_M
designator P*
仓库名称: 五金仓; 加工方式: 插件; 助记码: *; 备注: *; 物料代码: *; 单位: *; 物料名称: *; 规格型号: *
footprint HDR-1X15_M (排母，15脚)
pins: 1, 2, 3, 4, 5, 6, 7, 8, 9, 10, 11, 12, 13, 14, 15

## HDR  2.54MM  1X15_W
designator P*
仓库名称: 五金仓; 加工方式: 插件; 规格型号: *; 物料名称: *; 助记码: *; 单位: *; 备注: *; 物料代码: *
footprint HDR-1X15_W (弯脚排针，15脚)
pins: 1, 2, 3, 4, 5, 6, 7, 8, 9, 10, 11, 12, 13, 14, 15

## HDR  2.54MM  1X15_Y
designator P*
仓库名称: 五金仓; 加工方式: 插件; 备注: *; 单位: *; 助记码: *; 物料代码: *; 物料名称: *; 规格型号: *
footprint HDR-1X15_Y (圆孔排母，15脚)
pins: 1, 2, 3, 4, 5, 6, 7, 8, 9, 10, 11, 12, 13, 14, 15
